# Altium footprint library SMD_Bauteile.PcbLib: 355 footprints (part 15 of 23)
Each footprint in its own frame and in the unit in brackets; x right, y up, seen from the top. Pads: shape width x height; smd on the part's side, far side on the other; paste and mask are expansions set on the pad; w line width, h text height; cw(c..) or ccw(c..) is an arc to the next point about the centre after c.
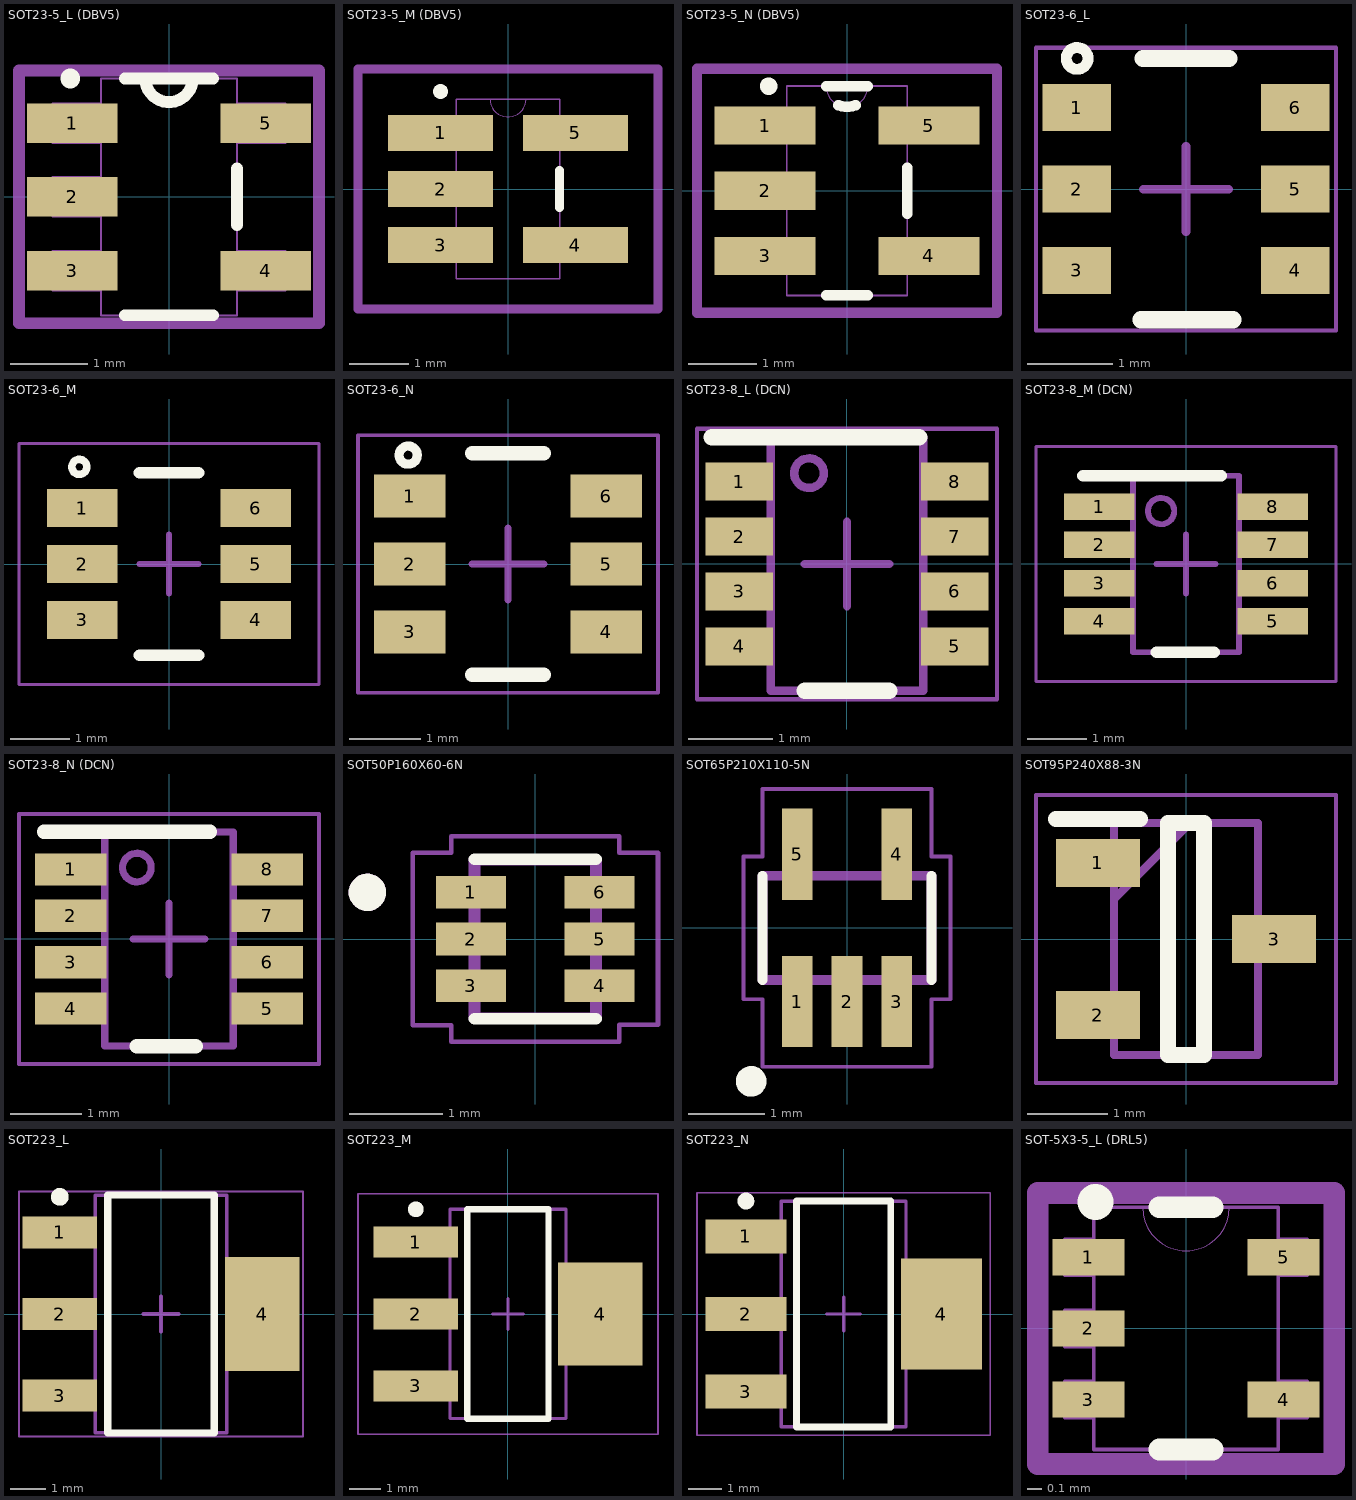
[diagram p14: the footprints below, top view; thin cyan lines are the x and y axes]

## SOT23-5_L (DBV5) [mil] "DBV"
height 57.09
pads (5):
  rect 46x20 smd: 1(-49,37.4) 2(-49,0) 3(-49,-37.4) 4(49,-37.4) 5(49,37.4)
Top Overlay:
  circle w10: c-50,60 r0.01
  lines w6: -22.41,-60 22.41,-60 ; -22.41,60 22.41,60 ; -12,60 ccw(c0,60) 12,60 ; 34.5,-14.3 34.5,14.3
Mech Misc 1:
  lines w0: -12,60 ccw(c0,60) 12,60
  lines w1: -59,-47.4 -34.5,-47.4 -34.5,-27.4 -59,-27.4 -59,-47.4 ; -59,-10 -34.5,-10 -34.5,10 -59,10 -59,-10 ; -59,27.4 -34.5,27.4 -34.5,47.4 -59,47.4 -59,27.4 ; -34.5,-60 -34.5,60 34.5,60 34.5,-60 -34.5,-60 ; 34.5,-47.4 59,-47.4 59,-27.4 34.5,-27.4 34.5,-47.4 ; 34.5,27.4 59,27.4 59,47.4 34.5,47.4 34.5,27.4
Mech 15:
  lines w6: -76,-64 76,-64 76,64 -76,64 -76,-64
3D body: height 10, standoff 0, extent 0,0 10,10
3D body "SOT23-5.stp": height 47.24, standoff 0, extent -55.11,-57.08 55.12,57.09

## SOT23-5_M (DBV5) [mil]
height 57.09
pads (5):
  rect 70x24 smd: 1(-45,37.4) 2(-45,0) 3(-45,-37.4) 4(45,-37.4) 5(45,37.4)
Top Overlay:
  circle w10: c-45,65 r0.01
  lines w6: 34.5,-12.3 34.5,12.3
Mech Misc 1:
  lines w0: -12,60 ccw(c0,60) 12,60
  lines w1: -59,-47.4 -59,-27.4 -34.5,-27.4 -34.5,-47.4 -59,-47.4 ; -59,-10 -59,10 -34.5,10 -34.5,-10 -59,-10 ; -59,27.4 -59,47.4 -34.5,47.4 -34.5,27.4 -59,27.4 ; -34.5,-60 34.5,-60 34.5,60 -34.5,60 -34.5,-60 ; 34.5,-47.4 34.5,-27.4 59,-27.4 59,-47.4 34.5,-47.4 ; 34.5,27.4 34.5,47.4 59,47.4 59,27.4 34.5,27.4
Mech 15:
  lines w6: -100,-80 -100,80 100,80 100,-80 -100,-80
3D body "SOT23-5.stp": height 47.24, standoff 0, extent -55.11,-57.08 55.12,57.09

## SOT23-5_N (DBV5) [mil]
height 57.09
pads (5):
  rect 58x22 smd: 1(-47,37.4) 2(-47,0) 3(-47,-37.4) 4(47,-37.4) 5(47,37.4)
Top Overlay:
  circle w10: c-45,60 r0.01
  lines w6: -11.91,-60 11.91,-60 ; -11.91,60 11.91,60 ; -4.92,49.05 ccw(c0,60) 4.92,49.05 ; 34.5,-13.3 34.5,13.3
Mech Misc 1:
  lines w0: -12,60 ccw(c0,60) 12,60
  lines w1: -59,-47.4 -34.5,-47.4 -34.5,-27.4 -59,-27.4 -59,-47.4 ; -59,-10 -34.5,-10 -34.5,10 -59,10 -59,-10 ; -59,27.4 -34.5,27.4 -34.5,47.4 -59,47.4 -59,27.4 ; -34.5,-60 -34.5,60 34.5,60 34.5,-60 -34.5,-60 ; 34.5,-47.4 59,-47.4 59,-27.4 34.5,-27.4 34.5,-47.4 ; 34.5,27.4 59,27.4 59,47.4 34.5,47.4 34.5,27.4
Mech 15:
  lines w6: -86,-70 86,-70 86,70 -86,70 -86,-70
3D body: height 10, standoff 0, extent 0,0 10,10
3D body "SOT23-5.stp": height 47.24, standoff 0, extent -55.11,-57.08 55.12,57.1

## SOT23-6_L [mm]
pads (6):
  rect 0.8x0.55 smd paste+0 mask+0.051: 1(-1.275,0.95) 2(-1.275,0) 3(-1.275,-0.95) 4(1.275,-0.95) 5(1.275,0) 6(1.275,0.95)
Top Overlay:
  circle w0.127: c-1.27,1.524 r0.127
  lines w0.2: -0.525,-1.525 0.55,-1.525 ; -0.5,1.525 0.5,1.525
Mech 15:
  lines w0.05: -1.75,-1.65 1.75,-1.65 1.75,1.65 -1.75,1.65 -1.75,-1.65
  lines w0.1: -0.5,0 0.5,0 ; 0,-0.5 0,0.5
3D body "DBV0006A.stp": height 1.2, standoff 0, extent -1.4,-1.45 1.4,1.45

## SOT23-6_M [mm]
pads (6):
  rect 1.2x0.65 smd paste+0 mask+0.051: 1(-1.475,0.95) 2(-1.475,0) 3(-1.475,-0.95) 4(1.475,-0.95) 5(1.475,0) 6(1.475,0.95)
Top Overlay:
  circle w0.127: c-1.524,1.651 r0.127
  lines w0.2: -0.5,-1.55 0.5,-1.55 ; -0.5,1.55 0.5,1.55
Mech 15:
  lines w0.05: -2.55,-2.05 2.55,-2.05 2.55,2.05 -2.55,2.05 -2.55,-2.05
  lines w0.1: -0.5,0 0.5,0 ; 0,-0.5 0,0.5
3D body "DBV0006A.stp": height 1.2, standoff 0, extent -1.4,-1.45 1.4,1.45

## SOT23-6_N [mm]
pads (6):
  rect 1x0.6 smd paste+0 mask+0.051: 1(-1.375,0.95) 2(-1.375,0) 3(-1.375,-0.95) 4(1.375,-0.95) 5(1.375,0) 6(1.375,0.95)
Top Overlay:
  circle w0.127: c-1.397,1.524 r0.127
  lines w0.2: -0.5,-1.55 0.5,-1.55 ; -0.5,1.55 0.5,1.55
Mech 15:
  lines w0.05: -2.1,-1.8 -2.1,1.8 2.1,1.8 2.1,-1.8 -2.1,-1.8
  lines w0.1: -0.5,0 0.5,0 ; 0,-0.5 0,0.5
3D body "DBV0006A.stp": height 1.2, standoff 0, extent -1.4,-1.45 1.4,1.45

## SOT23-8_L (DCN) [mm]
pads (8):
  rect 0.8x0.45 smd paste+0 mask+0.051: 1(-1.275,0.975) 2(-1.275,0.325) 3(-1.275,-0.325) 4(-1.275,-0.975) 5(1.275,-0.975) 6(1.275,-0.325) 7(1.275,0.325) 8(1.275,0.975)
Top Overlay:
  lines w0.2: -1.6,1.5 0.85,1.5 ; -0.5,-1.5 0.5,-1.5
Mech Misc 1:
  circle w0.1: c-0.45,1.075 r0.175
  lines w0.1: -0.9,-1.5 -0.9,1.5 0.9,1.5 0.9,-1.5 -0.9,-1.5
Mech 15:
  lines w0.05: -1.775,-1.6 -1.775,1.6 1.775,1.6 1.775,-1.6 -1.775,-1.6
  lines w0.1: -0.5,0 0.5,0 ; 0,-0.5 0,0.5
3D body: height 0.25, standoff 0, extent 0,0 0.254,0.254
3D body "DCN8.step": height 1.45, standoff 0, extent -1.499,-1.499 1.499,1.499

## SOT23-8_M (DCN) [mm]
pads (8):
  rect 1.2x0.45 smd paste+0 mask+0.051: 1(-1.475,0.975) 2(-1.475,0.325) 3(-1.475,-0.325) 4(-1.475,-0.975) 5(1.475,-0.975) 6(1.475,-0.325) 7(1.475,0.325) 8(1.475,0.975)
Top Overlay:
  lines w0.2: -1.75,1.5 0.6,1.5 ; -0.5,-1.5 0.475,-1.5
Mech Misc 1:
  circle w0.1: c-0.424,0.9 r0.224
  lines w0.1: -0.9,-1.5 0.9,-1.5 0.9,1.5 -0.9,1.5 -0.9,-1.5
Mech 15:
  lines w0.05: -2.55,-2 2.55,-2 2.55,2 -2.55,2 -2.55,-2
  lines w0.1: -0.5,0 0.5,0 ; 0,-0.5 0,0.5
3D body: height 0.25, standoff 0, extent 0,0 0.254,0.254
3D body "DCN8.step": height 1.45, standoff 0, extent -1.499,-1.499 1.499,1.499

## SOT23-8_N (DCN) [mm]
pads (8):
  rect 1x0.45 smd paste+0 mask+0.051: 1(-1.375,0.975) 2(-1.375,0.325) 3(-1.375,-0.325) 4(-1.375,-0.975) 5(1.375,-0.975) 6(1.375,-0.325) 7(1.375,0.325) 8(1.375,0.975)
Top Overlay:
  lines w0.2: -1.75,1.5 0.575,1.5 ; -0.45,-1.5 0.375,-1.5
Mech Misc 1:
  circle w0.1: c-0.45,1 r0.2
  lines w0.1: -0.9,-1.5 0.9,-1.5 0.9,1.5 -0.9,1.5 -0.9,-1.5
Mech 15:
  lines w0.05: -2.1,-1.75 -2.1,1.75 2.1,1.75 2.1,-1.75 -2.1,-1.75
  lines w0.1: -0.5,0 0.5,0 ; 0,-0.5 0,0.5
3D body: height 0.25, standoff 0, extent 0,0 0.254,0.254
3D body "DCN8.step": height 1.45, standoff 0, extent -1.499,-1.499 1.499,1.499

## SOT50P160X60-6N [mm]
pads (6):
  rect 0.75x0.35 smd: 1(-0.69,0.5) 2(-0.69,0) 3(-0.69,-0.5) 4(0.69,-0.5) 5(0.69,0) 6(0.69,0.5)
Top Overlay:
  circle w0.2: c-1.8,0.5 r0.1
  lines w0.127: -0.65,-0.855 0.65,-0.855 ; -0.65,0.855 0.65,0.855
Mech Misc 1:
  circle w0.2: c-1.8,0.5 r0.1
  circle w0.2: c-1.8,0.5 r0.1
  lines w0.127: -0.65,-0.85 0.65,-0.85 ; -0.65,-0.85 -0.65,0.85 ; -0.65,-0.85 0.65,-0.85 ; -0.65,-0.85 -0.65,0.85 ; -0.65,0.85 0.65,0.85 ; -0.65,0.85 0.65,0.85 ; 0.65,-0.85 0.65,0.85 ; 0.65,-0.85 0.65,0.85
Mech 15:
  lines w0.05: -1.315,-0.925 -0.9,-0.925 -0.9,-1.1 0.9,-1.1 0.9,-0.92 1.315,-0.92 1.315,0.925 0.9,0.925 0.9,1.1 -0.9,1.1 -0.9,0.925 -1.315,0.925 -1.315,-0.925

## SOT65P210X110-5N [mm]
pads (5):
  rect 0.4x1.19 smd: 1(-0.65,-0.96) 2(0,-0.96) 3(0.65,-0.96) 4(0.65,0.96) 5(-0.65,0.96)
Top Overlay:
  circle w0.2: c-1.25,-2 r0.1
  lines w0.127: -1.1,-0.68 -1.1,0.68 ; 1.1,-0.68 1.1,0.68
Mech Misc 1:
  lines w0.127: -1.1,-0.68 -1.1,0.68 ; -1.1,-0.68 1.1,-0.68 ; -1.1,-0.68 -1.1,0.68 ; -1.1,-0.68 1.1,-0.68 ; -1.1,0.68 1.1,0.68 ; -1.1,0.68 1.1,0.68 ; 1.1,-0.68 1.1,0.68 ; 1.1,-0.68 1.1,0.68
Mech 15:
  lines w0.05: -1.35,-0.93 -1.1,-0.93 -1.1,-1.81 1.1,-1.81 1.1,-0.93 1.35,-0.93 1.35,0.93 1.1,0.93 1.1,1.81 -1.1,1.81 -1.1,0.93 -1.35,0.93 -1.35,-0.93

## SOT95P240X88-3N [mm]
pads (3):
  rect 1.05x0.6 smd: 1(-1.1,0.95) 2(-1.1,-0.95) 3(1.1,0)
Top Overlay:
  lines w0.2: -1.625,1.5 -0.575,1.5 ; -0.225,-1.45 -0.225,1.45 0.225,1.45 0.225,-1.45 -0.225,-1.45
Mech 15:
  lines w0.1: -0.9,0.5 0.05,1.45 ; -0.9,-1.45 -0.9,1.45 0.9,1.45 0.9,-1.45 -0.9,-1.45
Top 3D Body:
  lines w0.05: -1.875,-1.8 -1.875,1.8 1.875,1.8 1.875,-1.8 -1.875,-1.8

## SOT223_L [mm] "SOT223, 4-Leads, Body 6.5x3.5mm, Pitch 2.3mm, Lead Span 7mm, IPC High Density"
height 1.8
pads (4):
  rect 2.1x0.9 smd: 1(-2.85,2.3) 2(-2.85,0) 3(-2.85,-2.3)
  rect 2.1x3.2 smd: 4(2.85,0)
Top Overlay:
  circle w0.25: c-2.85,3.3 r0.125
  lines w0.2: -1.5,-3.35 1.5,-3.35 1.5,3.35 -1.5,3.35 -1.5,-3.35
Mech Misc 1:
  lines w0.1: -1.85,-3.35 1.85,-3.35 1.85,3.35 -1.85,3.35 -1.85,-3.35
Mech 15:
  lines w0.05: -4,-3.45 4,-3.45 4,3.45 -4,3.45 -4,-3.45
  lines w0.1: -0.5,0 0.5,0 ; 0,-0.5 0,0.5
3D body: height 1.8, standoff 0.02, extent -1.85,-3.35 1.85,3.35

## SOT223_M [mm] "SOT223, 4-Leads, Body 6.5x3.5mm, Pitch 2.3mm, Lead Span 7mm, IPC Low Density"
height 1.8
pads (4):
  rect 2.7x1 smd: 1(-2.95,2.3) 2(-2.95,0) 3(-2.95,-2.3)
  rect 2.7x3.3 smd: 4(2.95,0)
Top Overlay:
  circle w0.25: c-2.95,3.35 r0.125
  lines w0.2: -1.3,-3.35 -1.3,3.35 1.3,3.35 1.3,-3.35 -1.3,-3.35
Mech Misc 1:
  lines w0.1: -1.85,-3.35 -1.85,3.35 1.85,3.35 1.85,-3.35 -1.85,-3.35
Mech 15:
  lines w0.05: -4.8,-3.85 -4.8,3.85 4.8,3.85 4.8,-3.85 -4.8,-3.85
  lines w0.1: -0.5,0 0.5,0 ; 0,-0.5 0,0.5
3D body: height 1.8, standoff 0.02, extent -1.85,-3.35 1.85,3.35

## SOT223_N [mm] "SOT223, 4-Leads, Body 6.5x3.5mm, Pitch 2.3mm, Lead Span 7mm, IPC Medium Density"
height 1.8
pads (4):
  rect 2.4x1 smd: 1(-2.9,2.3) 2(-2.9,0) 3(-2.9,-2.3)
  rect 2.4x3.3 smd: 4(2.9,0)
Top Overlay:
  circle w0.25: c-2.9,3.35 r0.125
  lines w0.2: -1.4,-3.35 -1.4,3.35 1.4,3.35 1.4,-3.35 -1.4,-3.35
Mech Misc 1:
  lines w0.1: -1.85,-3.35 -1.85,3.35 1.85,3.35 1.85,-3.35 -1.85,-3.35
Mech 15:
  lines w0.05: -4.35,-3.6 -4.35,3.6 4.35,3.6 4.35,-3.6 -4.35,-3.6
  lines w0.1: -0.5,0 0.5,0 ; 0,-0.5 0,0.5
3D body: height 1.8, standoff 0.02, extent -1.85,-3.35 1.85,3.35

## SOT-5X3-5_L (DRL5) [mil]
height 23.62
pads (5):
  rect 20x10 smd: 1(-27,19.68) 2(-27,0) 3(-27,-19.68) 4(27,-19.68) 5(27,19.68)
Top Overlay:
  circle w10: c-25,35 r0.01
  lines w6: -7.31,-33.5 7.31,-33.5 ; -7.31,33.5 7.31,33.5
Mech Misc 1:
  lines w0: -12,33.5 ccw(c0,33.5) 12,33.5
  lines w1: -33.5,-24.68 -25.5,-24.68 -25.5,-14.69 -33.5,-14.69 -33.5,-24.68 ; -33.5,-5 -25.5,-5 -25.5,5 -33.5,5 -33.5,-5 ; -33.5,14.69 -25.5,14.69 -25.5,24.68 -33.5,24.68 -33.5,14.69 ; -25.5,-33.5 -25.5,33.5 25.5,33.5 25.5,-33.5 -25.5,-33.5 ; 25.5,-24.68 33.5,-24.68 33.5,-14.69 25.5,-14.69 25.5,-24.68 ; 25.5,14.69 33.5,14.69 33.5,24.68 25.5,24.68 25.5,14.69
Mech 15:
  lines w6: -41,-37.5 41,-37.5 41,37.5 -41,37.5 -41,-37.5
3D body: height 10, standoff 0, extent 0,0 10,10
3D body "SOT-5X3-5.stp": height 23.62, standoff 0, extent -31.49,-31.49 31.5,31.5